# Altium schematic symbol library jlcpcb_2025_04_capacitors_extended_0201.schlib: 1175 symbols (part 4 of 7) (continued)
## GRM033R60J224ME90D
designator C?  Capacitance: 220nF  (hidden comment: *)
Capacitor, Ceramic (MLCC), 220nF, ±20%, 6.3V, X5R, ±20%, SMD 0201; Manufacturer: Murata Electronics; Manufacturer Part Number: GRM033R60J224ME90D; Package Size: 0201; JLCPCB Basic Part: No; JLCPCB Part Number: C161462; Supplier 1: LCSC; Category: Capacitors - MLCC; Supplier Part Number 1: C161462; Tolerance: ±20%; Voltage Rating: 6.3V; Temperature Coefficient: X5R; RoHS: Yes; ComponentLink1Description: Datasheet; ComponentLink1URL: https://wmsc.lcsc.com/wmsc/upload/file/pdf/v2/lcsc/2304140030_Murata-Electronics-GRM033R60J224ME90D_C161462.pdf; ComponentLink2Description: JLCPCB Part URL; ComponentLink2URL: https://jlcpcb.com/partdetail/C161462; ComponentLink3Description: LCSC Part URL; ComponentLink3URL: https://lcsc.com/product-detail/Multilayer-Ceramic-Capacitors-MLCC---SMD-SMT_Murata-Electronics-Murata-Electronics-GRM033R60J224ME90D_C161462.html
footprint CAP-0201 (0201 (0603M) Capacitor)
pins: 1, 2

## GRM033R60J225ME01D
designator C?  Capacitance: 2.2uF  (hidden comment: *)
Capacitor, Ceramic (MLCC), 2.2uF, ±20%, 6.3V, X5R, ±20%, SMD 0201; Manufacturer: Murata Electronics; Manufacturer Part Number: GRM033R60J225ME01D; Package Size: 0201; JLCPCB Basic Part: No; JLCPCB Part Number: C782150; Supplier 1: LCSC; Category: Capacitors - MLCC; Supplier Part Number 1: C782150; Tolerance: ±20%; Voltage Rating: 6.3V; Temperature Coefficient: X5R; RoHS: Yes; ComponentLink1Description: Datasheet; ComponentLink1URL: https://wmsc.lcsc.com/wmsc/upload/file/pdf/v2/lcsc/2009121209_Murata-Electronics-GRM033R60J225ME01D_C782150.pdf; ComponentLink2Description: JLCPCB Part URL; ComponentLink2URL: https://jlcpcb.com/partdetail/C782150; ComponentLink3Description: LCSC Part URL; ComponentLink3URL: https://lcsc.com/product-detail/Multilayer-Ceramic-Capacitors-MLCC---SMD-SMT_Murata-Electronics-Murata-Electronics-GRM033R60J225ME01D_C782150.html
footprint CAP-0201 (0201 (0603M) Capacitor)
pins: 1, 2

## GRM033R60J225ME47D
designator C?  Capacitance: 2.2uF  (hidden comment: *)
Capacitor, Ceramic (MLCC), 2.2uF, ±20%, 6.3V, X5R, ±20%, SMD 0201; Manufacturer: Murata Electronics; Manufacturer Part Number: GRM033R60J225ME47D; Package Size: 0201; JLCPCB Basic Part: No; JLCPCB Part Number: C76933; Supplier 1: LCSC; Category: Capacitors - MLCC; Supplier Part Number 1: C76933; Tolerance: ±20%; Voltage Rating: 6.3V; Temperature Coefficient: X5R; RoHS: Yes; ComponentLink1Description: Datasheet; ComponentLink1URL: https://wmsc.lcsc.com/wmsc/upload/file/pdf/v2/lcsc/1811081532_Murata-Electronics-GRM033R60J225ME47D_C76933.pdf; ComponentLink2Description: JLCPCB Part URL; ComponentLink2URL: https://jlcpcb.com/partdetail/C76933; ComponentLink3Description: LCSC Part URL; ComponentLink3URL: https://lcsc.com/product-detail/Multilayer-Ceramic-Capacitors-MLCC---SMD-SMT_Murata-Electronics-Murata-Electronics-GRM033R60J225ME47D_C76933.html
footprint CAP-0201 (0201 (0603M) Capacitor)
pins: 1, 2

## GRM033R60J334ME90D
designator C?  Capacitance: 330nF  (hidden comment: *)
Capacitor, Ceramic (MLCC), 330nF, ±20%, 6.3V, X5R, ±20%, SMD 0201; Manufacturer: Murata Electronics; Manufacturer Part Number: GRM033R60J334ME90D; Package Size: 0201; JLCPCB Basic Part: No; JLCPCB Part Number: C161463; Supplier 1: LCSC; Category: Capacitors - MLCC; Supplier Part Number 1: C161463; Tolerance: ±20%; Voltage Rating: 6.3V; Temperature Coefficient: X5R; RoHS: Yes; ComponentLink1Description: Datasheet; ComponentLink1URL: https://wmsc.lcsc.com/wmsc/upload/file/pdf/v2/lcsc/2304140030_Murata-Electronics-GRM033R60J334ME90D_C161463.pdf; ComponentLink2Description: JLCPCB Part URL; ComponentLink2URL: https://jlcpcb.com/partdetail/C161463; ComponentLink3Description: LCSC Part URL; ComponentLink3URL: https://lcsc.com/product-detail/Multilayer-Ceramic-Capacitors-MLCC---SMD-SMT_Murata-Electronics-Murata-Electronics-GRM033R60J334ME90D_C161463.html
footprint CAP-0201 (0201 (0603M) Capacitor)
pins: 1, 2

## GRM033R60J473KE19D
designator C?  Capacitance: 47nF  (hidden comment: *)
Capacitor, Ceramic (MLCC), 47nF, ±10%, 6.3V, X5R, ±10%, SMD 0201; Manufacturer: Murata Electronics; Manufacturer Part Number: GRM033R60J473KE19D; Package Size: 0201; JLCPCB Basic Part: No; JLCPCB Part Number: C85925; Supplier 1: LCSC; Category: Capacitors - MLCC; Supplier Part Number 1: C85925; Tolerance: ±10%; Voltage Rating: 6.3V; Temperature Coefficient: X5R; RoHS: Yes; ComponentLink1Description: Datasheet; ComponentLink1URL: https://wmsc.lcsc.com/wmsc/upload/file/pdf/v2/lcsc/2304140030_Murata-Electronics-GRM033R60J473KE19D_C85925.pdf; ComponentLink2Description: JLCPCB Part URL; ComponentLink2URL: https://jlcpcb.com/partdetail/C85925; ComponentLink3Description: LCSC Part URL; ComponentLink3URL: https://lcsc.com/product-detail/Multilayer-Ceramic-Capacitors-MLCC---SMD-SMT_Murata-Electronics-Murata-Electronics-GRM033R60J473KE19D_C85925.html
footprint CAP-0201 (0201 (0603M) Capacitor)
pins: 1, 2

## GRM033R60J474KE90D
designator C?  Capacitance: 470nF  (hidden comment: *)
Capacitor, Ceramic (MLCC), 470nF, ±10%, 6.3V, X5R, ±10%, SMD 0201; Manufacturer: Murata Electronics; Manufacturer Part Number: GRM033R60J474KE90D; Package Size: 0201; JLCPCB Basic Part: No; JLCPCB Part Number: C85926; Supplier 1: LCSC; Category: Capacitors - MLCC; Supplier Part Number 1: C85926; Tolerance: ±10%; Voltage Rating: 6.3V; Temperature Coefficient: X5R; RoHS: Yes; ComponentLink1Description: Datasheet; ComponentLink1URL: https://wmsc.lcsc.com/wmsc/upload/file/pdf/v2/lcsc/2212052030_Murata-Electronics-GRM033R60J474KE90D_C85926.pdf; ComponentLink2Description: JLCPCB Part URL; ComponentLink2URL: https://jlcpcb.com/partdetail/C85926; ComponentLink3Description: LCSC Part URL; ComponentLink3URL: https://lcsc.com/product-detail/Multilayer-Ceramic-Capacitors-MLCC---SMD-SMT_Murata-Electronics-Murata-Electronics-GRM033R60J474KE90D_C85926.html
footprint CAP-0201 (0201 (0603M) Capacitor)
pins: 1, 2

## GRM033R60J475ME05D
designator C?  Capacitance: 4.7uF  (hidden comment: *)
Capacitor, Ceramic (MLCC), 4.7uF, ±20%, 6.3V, X5R, ±20%, SMD 0201; Manufacturer: Murata Electronics; Manufacturer Part Number: GRM033R60J475ME05D; Package Size: 0201; JLCPCB Basic Part: No; JLCPCB Part Number: C3863497; Supplier 1: LCSC; Category: Capacitors - MLCC; Supplier Part Number 1: C3863497; Tolerance: ±20%; Voltage Rating: 6.3V; Temperature Coefficient: X5R; RoHS: Yes; ComponentLink1Description: Datasheet; ComponentLink1URL: https://wmsc.lcsc.com/wmsc/upload/file/pdf/v2/lcsc/2301301130_Murata-Electronics-GRM033R60J475ME05D_C3863497.pdf; ComponentLink2Description: JLCPCB Part URL; ComponentLink2URL: https://jlcpcb.com/partdetail/C3863497; ComponentLink3Description: LCSC Part URL; ComponentLink3URL: https://lcsc.com/product-detail/Multilayer-Ceramic-Capacitors-MLCC---SMD-SMT_Murata-Electronics-Murata-Electronics-GRM033R60J475ME05D_C3863497.html
footprint CAP-0201 (0201 (0603M) Capacitor)
pins: 1, 2

## GRM033R60J683KE19D
designator C?  Capacitance: 68nF  (hidden comment: *)
Capacitor, Ceramic (MLCC), 68nF, ±10%, 6.3V, X5R, ±10%, SMD 0201; Manufacturer: Murata Electronics; Manufacturer Part Number: GRM033R60J683KE19D; Package Size: 0201; JLCPCB Basic Part: No; JLCPCB Part Number: C161465; Supplier 1: LCSC; Category: Capacitors - MLCC; Supplier Part Number 1: C161465; Tolerance: ±10%; Voltage Rating: 6.3V; Temperature Coefficient: X5R; RoHS: Yes; ComponentLink1Description: Datasheet; ComponentLink1URL: https://wmsc.lcsc.com/wmsc/upload/file/pdf/v2/lcsc/2304140030_Murata-Electronics-GRM033R60J683KE19D_C161465.pdf; ComponentLink2Description: JLCPCB Part URL; ComponentLink2URL: https://jlcpcb.com/partdetail/C161465; ComponentLink3Description: LCSC Part URL; ComponentLink3URL: https://lcsc.com/product-detail/Multilayer-Ceramic-Capacitors-MLCC---SMD-SMT_Murata-Electronics-Murata-Electronics-GRM033R60J683KE19D_C161465.html
footprint CAP-0201 (0201 (0603M) Capacitor)
pins: 1, 2

## GRM033R60J823KE19D
designator C?  Capacitance: 82nF  (hidden comment: *)
Capacitor, Ceramic (MLCC), 82nF, ±10%, 6.3V, X5R, ±10%, SMD 0201; Manufacturer: Murata Electronics; Manufacturer Part Number: GRM033R60J823KE19D; Package Size: 0201; JLCPCB Basic Part: No; JLCPCB Part Number: C426105; Supplier 1: LCSC; Category: Capacitors - MLCC; Supplier Part Number 1: C426105; Tolerance: ±10%; Voltage Rating: 6.3V; Temperature Coefficient: X5R; RoHS: Yes; ComponentLink1Description: Datasheet; ComponentLink1URL: https://wmsc.lcsc.com/wmsc/upload/file/pdf/v2/lcsc/2304140030_Murata-Electronics-GRM033R60J823KE19D_C426105.pdf; ComponentLink2Description: JLCPCB Part URL; ComponentLink2URL: https://jlcpcb.com/partdetail/C426105; ComponentLink3Description: LCSC Part URL; ComponentLink3URL: https://lcsc.com/product-detail/Multilayer-Ceramic-Capacitors-MLCC---SMD-SMT_Murata-Electronics-Murata-Electronics-GRM033R60J823KE19D_C426105.html
footprint CAP-0201 (0201 (0603M) Capacitor)
pins: 1, 2

## GRM033R61A103KA01D
designator C?  Capacitance: 10nF  (hidden comment: *)
Capacitor, Ceramic (MLCC), 10nF, ±10%, 10V, X5R, ±10%, SMD 0201; Manufacturer: Murata Electronics; Manufacturer Part Number: GRM033R61A103KA01D; Package Size: 0201; JLCPCB Basic Part: No; JLCPCB Part Number: C97859; Supplier 1: LCSC; Category: Capacitors - MLCC; Supplier Part Number 1: C97859; Tolerance: ±10%; Voltage Rating: 10V; Temperature Coefficient: X5R; RoHS: Yes; ComponentLink1Description: Datasheet; ComponentLink1URL: https://wmsc.lcsc.com/wmsc/upload/file/pdf/v2/lcsc/1811081531_Murata-Electronics-GRM033R61A103KA01D_C97859.pdf; ComponentLink2Description: JLCPCB Part URL; ComponentLink2URL: https://jlcpcb.com/partdetail/C97859; ComponentLink3Description: LCSC Part URL; ComponentLink3URL: https://lcsc.com/product-detail/Multilayer-Ceramic-Capacitors-MLCC---SMD-SMT_Murata-Electronics-Murata-Electronics-GRM033R61A103KA01D_C97859.html
footprint CAP-0201 (0201 (0603M) Capacitor)
pins: 1, 2

## GRM033R61A104KE15D
designator C?  Capacitance: 100nF  (hidden comment: *)
Capacitor, Ceramic (MLCC), 100nF, ±10%, 10V, X5R, ±10%, SMD 0201; Manufacturer: Murata Electronics; Manufacturer Part Number: GRM033R61A104KE15D; Package Size: 0201; JLCPCB Basic Part: No; JLCPCB Part Number: C76934; Supplier 1: LCSC; Category: Capacitors - MLCC; Supplier Part Number 1: C76934; Tolerance: ±10%; Voltage Rating: 10V; Temperature Coefficient: X5R; RoHS: Yes; ComponentLink1Description: Datasheet; ComponentLink1URL: https://wmsc.lcsc.com/wmsc/upload/file/pdf/v2/lcsc/1811081532_Murata-Electronics-GRM033R61A104KE15D_C76934.pdf; ComponentLink2Description: JLCPCB Part URL; ComponentLink2URL: https://jlcpcb.com/partdetail/C76934; ComponentLink3Description: LCSC Part URL; ComponentLink3URL: https://lcsc.com/product-detail/Multilayer-Ceramic-Capacitors-MLCC---SMD-SMT_Murata-Electronics-Murata-Electronics-GRM033R61A104KE15D_C76934.html
footprint CAP-0201 (0201 (0603M) Capacitor)
pins: 1, 2

## GRM033R61A104KE84D
designator C?  Capacitance: 100nF  (hidden comment: *)
Capacitor, Ceramic (MLCC), 100nF, ±10%, 10V, X5R, ±10%, SMD 0201; Manufacturer: Murata Electronics; Manufacturer Part Number: GRM033R61A104KE84D; Package Size: 0201; JLCPCB Basic Part: No; JLCPCB Part Number: C161466; Supplier 1: LCSC; Category: Capacitors - MLCC; Supplier Part Number 1: C161466; Tolerance: ±10%; Voltage Rating: 10V; Temperature Coefficient: X5R; RoHS: Yes; ComponentLink1Description: Datasheet; ComponentLink1URL: https://wmsc.lcsc.com/wmsc/upload/file/pdf/v2/lcsc/1811081546_Murata-Electronics-GRM033R61A104KE84D_C161466.pdf; ComponentLink2Description: JLCPCB Part URL; ComponentLink2URL: https://jlcpcb.com/partdetail/C161466; ComponentLink3Description: LCSC Part URL; ComponentLink3URL: https://lcsc.com/product-detail/Multilayer-Ceramic-Capacitors-MLCC---SMD-SMT_Murata-Electronics-Murata-Electronics-GRM033R61A104KE84D_C161466.html
footprint CAP-0201 (0201 (0603M) Capacitor)
pins: 1, 2

## GRM033R61A104ME15D
designator C?  Capacitance: 100nF  (hidden comment: *)
Capacitor, Ceramic (MLCC), 100nF, ±20%, 10V, X5R, ±20%, SMD 0201; Manufacturer: Murata Electronics; Manufacturer Part Number: GRM033R61A104ME15D; Package Size: 0201; JLCPCB Basic Part: No; JLCPCB Part Number: C408130; Supplier 1: LCSC; Category: Capacitors - MLCC; Supplier Part Number 1: C408130; Tolerance: ±20%; Voltage Rating: 10V; Temperature Coefficient: X5R; RoHS: Yes; ComponentLink1Description: Datasheet; ComponentLink1URL: https://wmsc.lcsc.com/wmsc/upload/file/pdf/v2/lcsc/2304140030_Murata-Electronics-GRM033R61A104ME15D_C408130.pdf; ComponentLink2Description: JLCPCB Part URL; ComponentLink2URL: https://jlcpcb.com/partdetail/C408130; ComponentLink3Description: LCSC Part URL; ComponentLink3URL: https://lcsc.com/product-detail/Multilayer-Ceramic-Capacitors-MLCC---SMD-SMT_Murata-Electronics-Murata-Electronics-GRM033R61A104ME15D_C408130.html
footprint CAP-0201 (0201 (0603M) Capacitor)
pins: 1, 2

## GRM033R61A105ME44D
designator C?  Capacitance: 1uF  (hidden comment: *)
Capacitor, Ceramic (MLCC), 1uF, ±20%, 10V, X5R, ±20%, SMD 0201; Manufacturer: Murata Electronics; Manufacturer Part Number: GRM033R61A105ME44D; Package Size: 0201; JLCPCB Basic Part: No; JLCPCB Part Number: C76935; Supplier 1: LCSC; Category: Capacitors - MLCC; Supplier Part Number 1: C76935; Tolerance: ±20%; Voltage Rating: 10V; Temperature Coefficient: X5R; RoHS: Yes; ComponentLink1Description: Datasheet; ComponentLink1URL: https://wmsc.lcsc.com/wmsc/upload/file/pdf/v2/lcsc/2304140030_Murata-Electronics-GRM033R61A105ME44D_C76935.pdf; ComponentLink2Description: JLCPCB Part URL; ComponentLink2URL: https://jlcpcb.com/partdetail/C76935; ComponentLink3Description: LCSC Part URL; ComponentLink3URL: https://lcsc.com/product-detail/Multilayer-Ceramic-Capacitors-MLCC---SMD-SMT_Murata-Electronics-Murata-Electronics-GRM033R61A105ME44D_C76935.html
footprint CAP-0201 (0201 (0603M) Capacitor)
pins: 1, 2

## GRM033R61A123KE84D
designator C?  Capacitance: 12nF  (hidden comment: *)
Capacitor, Ceramic (MLCC), 12nF, ±10%, ±10%, SMD 0201; Manufacturer: Murata Electronics; Manufacturer Part Number: GRM033R61A123KE84D; Package Size: 0201; JLCPCB Basic Part: No; JLCPCB Part Number: C883551; Supplier 1: LCSC; Category: Capacitors - MLCC; Supplier Part Number 1: C883551; Tolerance: ±10%; RoHS: Yes; ComponentLink1Description: Datasheet; ComponentLink1URL: https://wmsc.lcsc.com/wmsc/upload/file/pdf/v2/lcsc/2304140030_Murata-Electronics-GRM033R61A123KE84D_C883551.pdf; ComponentLink2Description: JLCPCB Part URL; ComponentLink2URL: https://jlcpcb.com/partdetail/C883551; ComponentLink3Description: LCSC Part URL; ComponentLink3URL: https://lcsc.com/product-detail/Multilayer-Ceramic-Capacitors-MLCC---SMD-SMT_Murata-Electronics-Murata-Electronics-GRM033R61A123KE84D_C883551.html
footprint CAP-0201 (0201 (0603M) Capacitor)
pins: 1, 2

## GRM033R61A152KA01D
designator C?  Capacitance: 1.5nF  (hidden comment: *)
Capacitor, Ceramic (MLCC), 1.5nF, ±10%, 10V, X5R, ±10%, SMD 0201; Manufacturer: Murata Electronics; Manufacturer Part Number: GRM033R61A152KA01D; Package Size: 0201; JLCPCB Basic Part: No; JLCPCB Part Number: C723322; Supplier 1: LCSC; Category: Capacitors - MLCC; Supplier Part Number 1: C723322; Tolerance: ±10%; Voltage Rating: 10V; Temperature Coefficient: X5R; RoHS: Yes; ComponentLink1Description: Datasheet; ComponentLink1URL: https://wmsc.lcsc.com/wmsc/upload/file/pdf/v2/lcsc/2304140030_Murata-Electronics-GRM033R61A152KA01D_C723322.pdf; ComponentLink2Description: JLCPCB Part URL; ComponentLink2URL: https://jlcpcb.com/partdetail/C723322; ComponentLink3Description: LCSC Part URL; ComponentLink3URL: https://lcsc.com/product-detail/Multilayer-Ceramic-Capacitors-MLCC---SMD-SMT_Murata-Electronics-Murata-Electronics-GRM033R61A152KA01D_C723322.html
footprint CAP-0201 (0201 (0603M) Capacitor)
pins: 1, 2

## GRM033R61A183KE84D
designator C?  Capacitance: 18nF  (hidden comment: *)
Capacitor, Ceramic (MLCC), 18nF, ±10%, ±10%, SMD 0201; Manufacturer: Murata Electronics; Manufacturer Part Number: GRM033R61A183KE84D; Package Size: 0201; JLCPCB Basic Part: No; JLCPCB Part Number: C521081; Supplier 1: LCSC; Category: Capacitors - MLCC; Supplier Part Number 1: C521081; Tolerance: ±10%; RoHS: Yes; ComponentLink1Description: Datasheet; ComponentLink1URL: https://wmsc.lcsc.com/wmsc/upload/file/pdf/v2/lcsc/2308111810_Murata-Electronics-GRM033R61A183KE84D_C521081.pdf; ComponentLink2Description: JLCPCB Part URL; ComponentLink2URL: https://jlcpcb.com/partdetail/C521081; ComponentLink3Description: LCSC Part URL; ComponentLink3URL: https://lcsc.com/product-detail/Multilayer-Ceramic-Capacitors-MLCC---SMD-SMT_Murata-Electronics-Murata-Electronics-GRM033R61A183KE84D_C521081.html
footprint CAP-0201 (0201 (0603M) Capacitor)
pins: 1, 2

## GRM033R61A222KA01D
designator C?  Capacitance: 2.2nF  (hidden comment: *)
Capacitor, Ceramic (MLCC), 2.2nF, ±10%, 10V, X5R, ±10%, SMD 0201; Manufacturer: Murata Electronics; Manufacturer Part Number: GRM033R61A222KA01D; Package Size: 0201; JLCPCB Basic Part: No; JLCPCB Part Number: C337486; Supplier 1: LCSC; Category: Capacitors - MLCC; Supplier Part Number 1: C337486; Tolerance: ±10%; Voltage Rating: 10V; Temperature Coefficient: X5R; RoHS: Yes; ComponentLink1Description: Datasheet; ComponentLink1URL: https://wmsc.lcsc.com/wmsc/upload/file/pdf/v2/lcsc/2304140030_Murata-Electronics-GRM033R61A222KA01D_C337486.pdf; ComponentLink2Description: JLCPCB Part URL; ComponentLink2URL: https://jlcpcb.com/partdetail/C337486; ComponentLink3Description: LCSC Part URL; ComponentLink3URL: https://lcsc.com/product-detail/Multilayer-Ceramic-Capacitors-MLCC---SMD-SMT_Murata-Electronics-Murata-Electronics-GRM033R61A222KA01D_C337486.html
footprint CAP-0201 (0201 (0603M) Capacitor)
pins: 1, 2

## GRM033R61A224KE90D
designator C?  Capacitance: 220nF  (hidden comment: *)
Capacitor, Ceramic (MLCC), 220nF, ±10%, 10V, X5R, ±10%, SMD 0201; Manufacturer: Murata Electronics; Manufacturer Part Number: GRM033R61A224KE90D; Package Size: 0201; JLCPCB Basic Part: No; JLCPCB Part Number: C76936; Supplier 1: LCSC; Category: Capacitors - MLCC; Supplier Part Number 1: C76936; Tolerance: ±10%; Voltage Rating: 10V; Temperature Coefficient: X5R; RoHS: Yes; ComponentLink1Description: Datasheet; ComponentLink1URL: https://wmsc.lcsc.com/wmsc/upload/file/pdf/v2/lcsc/1811081514_Murata-Electronics-GRM033R61A224KE90D_C76936.pdf; ComponentLink2Description: JLCPCB Part URL; ComponentLink2URL: https://jlcpcb.com/partdetail/C76936; ComponentLink3Description: LCSC Part URL; ComponentLink3URL: https://lcsc.com/product-detail/Multilayer-Ceramic-Capacitors-MLCC---SMD-SMT_Murata-Electronics-Murata-Electronics-GRM033R61A224KE90D_C76936.html
footprint CAP-0201 (0201 (0603M) Capacitor)
pins: 1, 2

## GRM033R61A224ME90D
designator C?  Capacitance: 220nF  (hidden comment: *)
Capacitor, Ceramic (MLCC), 220nF, ±20%, 10V, X5R, ±20%, SMD 0201; Manufacturer: Murata Electronics; Manufacturer Part Number: GRM033R61A224ME90D; Package Size: 0201; JLCPCB Basic Part: No; JLCPCB Part Number: C161468; Supplier 1: LCSC; Category: Capacitors - MLCC; Supplier Part Number 1: C161468; Tolerance: ±20%; Voltage Rating: 10V; Temperature Coefficient: X5R; RoHS: Yes; ComponentLink1Description: Datasheet; ComponentLink1URL: https://wmsc.lcsc.com/wmsc/upload/file/pdf/v2/lcsc/2304140030_Murata-Electronics-GRM033R61A224ME90D_C161468.pdf; ComponentLink2Description: JLCPCB Part URL; ComponentLink2URL: https://jlcpcb.com/partdetail/C161468; ComponentLink3Description: LCSC Part URL; ComponentLink3URL: https://lcsc.com/product-detail/Multilayer-Ceramic-Capacitors-MLCC---SMD-SMT_Murata-Electronics-Murata-Electronics-GRM033R61A224ME90D_C161468.html
footprint CAP-0201 (0201 (0603M) Capacitor)
pins: 1, 2

## GRM033R61A225KE47D
designator C?  Capacitance: 2.2uF  (hidden comment: *)
Capacitor, Ceramic (MLCC), 2.2uF, ±10%, 10V, X5R, ±10%, SMD 0201; Manufacturer: Murata Electronics; Manufacturer Part Number: GRM033R61A225KE47D; Package Size: 0201; JLCPCB Basic Part: No; JLCPCB Part Number: C335106; Supplier 1: LCSC; Category: Capacitors - MLCC; Supplier Part Number 1: C335106; Tolerance: ±10%; Voltage Rating: 10V; Temperature Coefficient: X5R; RoHS: Yes; ComponentLink1Description: Datasheet; ComponentLink1URL: https://wmsc.lcsc.com/wmsc/upload/file/pdf/v2/lcsc/2304140030_Murata-Electronics-GRM033R61A225KE47D_C335106.pdf; ComponentLink2Description: JLCPCB Part URL; ComponentLink2URL: https://jlcpcb.com/partdetail/C335106; ComponentLink3Description: LCSC Part URL; ComponentLink3URL: https://lcsc.com/product-detail/Multilayer-Ceramic-Capacitors-MLCC---SMD-SMT_Murata-Electronics-Murata-Electronics-GRM033R61A225KE47D_C335106.html
footprint CAP-0201 (0201 (0603M) Capacitor)
pins: 1, 2

## GRM033R61A225ME47D
designator C?  Capacitance: 2.2uF  (hidden comment: *)
Capacitor, Ceramic (MLCC), 2.2uF, ±20%, 10V, X5R, ±20%, SMD 0201; Manufacturer: Murata Electronics; Manufacturer Part Number: GRM033R61A225ME47D; Package Size: 0201; JLCPCB Basic Part: No; JLCPCB Part Number: C319184; Supplier 1: LCSC; Category: Capacitors - MLCC; Supplier Part Number 1: C319184; Tolerance: ±20%; Voltage Rating: 10V; Temperature Coefficient: X5R; RoHS: Yes; ComponentLink1Description: Datasheet; ComponentLink1URL: https://wmsc.lcsc.com/wmsc/upload/file/pdf/v2/lcsc/1811081547_Murata-Electronics-GRM033R61A225ME47D_C319184.pdf; ComponentLink2Description: JLCPCB Part URL; ComponentLink2URL: https://jlcpcb.com/partdetail/C319184; ComponentLink3Description: LCSC Part URL; ComponentLink3URL: https://lcsc.com/product-detail/Multilayer-Ceramic-Capacitors-MLCC---SMD-SMT_Murata-Electronics-Murata-Electronics-GRM033R61A225ME47D_C319184.html
footprint CAP-0201 (0201 (0603M) Capacitor)
pins: 1, 2

## GRM033R61A272KA01D
designator C?  Capacitance: 2.7nF  (hidden comment: *)
Capacitor, Ceramic (MLCC), 2.7nF, ±10%, 10V, X5R, ±10%, SMD 0201; Manufacturer: Murata Electronics; Manufacturer Part Number: GRM033R61A272KA01D; Package Size: 0201; JLCPCB Basic Part: No; JLCPCB Part Number: C913656; Supplier 1: LCSC; Category: Capacitors - MLCC; Supplier Part Number 1: C913656; Tolerance: ±10%; Voltage Rating: 10V; Temperature Coefficient: X5R; RoHS: Yes; ComponentLink1Description: Datasheet; ComponentLink1URL: https://wmsc.lcsc.com/wmsc/upload/file/pdf/v2/lcsc/2201131300_Murata-Electronics-GRM033R61A272KA01D_C913656.pdf; ComponentLink2Description: JLCPCB Part URL; ComponentLink2URL: https://jlcpcb.com/partdetail/C913656; ComponentLink3Description: LCSC Part URL; ComponentLink3URL: https://lcsc.com/product-detail/Multilayer-Ceramic-Capacitors-MLCC---SMD-SMT_Murata-Electronics-Murata-Electronics-GRM033R61A272KA01D_C913656.html
footprint CAP-0201 (0201 (0603M) Capacitor)
pins: 1, 2

## GRM033R61A333KE84D
designator C?  Capacitance: 33nF  (hidden comment: *)
Capacitor, Ceramic (MLCC), 33nF, ±10%, 10V, X5R, ±10%, SMD 0201; Manufacturer: Murata Electronics; Manufacturer Part Number: GRM033R61A333KE84D; Package Size: 0201; JLCPCB Basic Part: No; JLCPCB Part Number: C237415; Supplier 1: LCSC; Category: Capacitors - MLCC; Supplier Part Number 1: C237415; Tolerance: ±10%; Voltage Rating: 10V; Temperature Coefficient: X5R; RoHS: Yes; ComponentLink1Description: Datasheet; ComponentLink1URL: https://wmsc.lcsc.com/wmsc/upload/file/pdf/v2/lcsc/2304140030_Murata-Electronics-GRM033R61A333KE84D_C237415.pdf; ComponentLink2Description: JLCPCB Part URL; ComponentLink2URL: https://jlcpcb.com/partdetail/C237415; ComponentLink3Description: LCSC Part URL; ComponentLink3URL: https://lcsc.com/product-detail/Multilayer-Ceramic-Capacitors-MLCC---SMD-SMT_Murata-Electronics-Murata-Electronics-GRM033R61A333KE84D_C237415.html
footprint CAP-0201 (0201 (0603M) Capacitor)
pins: 1, 2

## GRM033R61A472KA01D
designator C?  Capacitance: 4.7nF  (hidden comment: *)
Capacitor, Ceramic (MLCC), 4.7nF, ±10%, 10V, X5R, ±10%, SMD 0201; Manufacturer: Murata Electronics; Manufacturer Part Number: GRM033R61A472KA01D; Package Size: 0201; JLCPCB Basic Part: No; JLCPCB Part Number: C161470; Supplier 1: LCSC; Category: Capacitors - MLCC; Supplier Part Number 1: C161470; Tolerance: ±10%; Voltage Rating: 10V; Temperature Coefficient: X5R; RoHS: Yes; ComponentLink1Description: Datasheet; ComponentLink1URL: https://wmsc.lcsc.com/wmsc/upload/file/pdf/v2/lcsc/2304140030_Murata-Electronics-GRM033R61A472KA01D_C161470.pdf; ComponentLink2Description: JLCPCB Part URL; ComponentLink2URL: https://jlcpcb.com/partdetail/C161470; ComponentLink3Description: LCSC Part URL; ComponentLink3URL: https://lcsc.com/product-detail/Multilayer-Ceramic-Capacitors-MLCC---SMD-SMT_Murata-Electronics-Murata-Electronics-GRM033R61A472KA01D_C161470.html
footprint CAP-0201 (0201 (0603M) Capacitor)
pins: 1, 2

## GRM033R61A562KA01D
designator C?  Capacitance: 5.6nF  (hidden comment: *)
Capacitor, Ceramic (MLCC), 5.6nF, ±10%, 10V, X5R, ±10%, SMD 0201; Manufacturer: Murata Electronics; Manufacturer Part Number: GRM033R61A562KA01D; Package Size: 0201; JLCPCB Basic Part: No; JLCPCB Part Number: C2171618; Supplier 1: LCSC; Category: Capacitors - MLCC; Supplier Part Number 1: C2171618; Tolerance: ±10%; Voltage Rating: 10V; Temperature Coefficient: X5R; RoHS: Yes; ComponentLink1Description: Datasheet; ComponentLink1URL: https://wmsc.lcsc.com/wmsc/upload/file/pdf/v2/lcsc/2308111716_Murata-Electronics-GRM033R61A562KA01D_C2171618.pdf; ComponentLink2Description: JLCPCB Part URL; ComponentLink2URL: https://jlcpcb.com/partdetail/C2171618; ComponentLink3Description: LCSC Part URL; ComponentLink3URL: https://lcsc.com/product-detail/Multilayer-Ceramic-Capacitors-MLCC---SMD-SMT_Murata-Electronics-Murata-Electronics-GRM033R61A562KA01D_C2171618.html
footprint CAP-0201 (0201 (0603M) Capacitor)
pins: 1, 2

## GRM033R61A682KA01D
designator C?  Capacitance: 6.8nF  (hidden comment: *)
Capacitor, Ceramic (MLCC), 6.8nF, ±10%, 10V, X5R, ±10%, SMD 0201; Manufacturer: Murata Electronics; Manufacturer Part Number: GRM033R61A682KA01D; Package Size: 0201; JLCPCB Basic Part: No; JLCPCB Part Number: C161471; Supplier 1: LCSC; Category: Capacitors - MLCC; Supplier Part Number 1: C161471; Tolerance: ±10%; Voltage Rating: 10V; Temperature Coefficient: X5R; RoHS: Yes; ComponentLink1Description: Datasheet; ComponentLink1URL: https://wmsc.lcsc.com/wmsc/upload/file/pdf/v2/lcsc/1811081546_Murata-Electronics-GRM033R61A682KA01D_C161471.pdf; ComponentLink2Description: JLCPCB Part URL; ComponentLink2URL: https://jlcpcb.com/partdetail/C161471; ComponentLink3Description: LCSC Part URL; ComponentLink3URL: https://lcsc.com/product-detail/Multilayer-Ceramic-Capacitors-MLCC---SMD-SMT_Murata-Electronics-Murata-Electronics-GRM033R61A682KA01D_C161471.html
footprint CAP-0201 (0201 (0603M) Capacitor)
pins: 1, 2

## GRM033R61C103KA12D
designator C?  Capacitance: 10nF  (hidden comment: *)
Capacitor, Ceramic (MLCC), 10nF, ±10%, 16V, X5R, ±10%, SMD 0201; Manufacturer: Murata Electronics; Manufacturer Part Number: GRM033R61C103KA12D; Package Size: 0201; JLCPCB Basic Part: No; JLCPCB Part Number: C161472; Supplier 1: LCSC; Category: Capacitors - MLCC; Supplier Part Number 1: C161472; Tolerance: ±10%; Voltage Rating: 16V; Temperature Coefficient: X5R; RoHS: Yes; ComponentLink1Description: Datasheet; ComponentLink1URL: https://wmsc.lcsc.com/wmsc/upload/file/pdf/v2/lcsc/1811081530_Murata-Electronics-GRM033R61C103KA12D_C161472.pdf; ComponentLink2Description: JLCPCB Part URL; ComponentLink2URL: https://jlcpcb.com/partdetail/C161472; ComponentLink3Description: LCSC Part URL; ComponentLink3URL: https://lcsc.com/product-detail/Multilayer-Ceramic-Capacitors-MLCC---SMD-SMT_Murata-Electronics-Murata-Electronics-GRM033R61C103KA12D_C161472.html
footprint CAP-0201 (0201 (0603M) Capacitor)
pins: 1, 2

## GRM033R61C103MA12D
designator C?  Capacitance: 10nF  (hidden comment: *)
Capacitor, Ceramic (MLCC), 10nF, ±20%, 16V, X5R, ±20%, SMD 0201; Manufacturer: Murata Electronics; Manufacturer Part Number: GRM033R61C103MA12D; Package Size: 0201; JLCPCB Basic Part: No; JLCPCB Part Number: C2183908; Supplier 1: LCSC; Category: Capacitors - MLCC; Supplier Part Number 1: C2183908; Tolerance: ±20%; Voltage Rating: 16V; Temperature Coefficient: X5R; RoHS: Yes; ComponentLink1Description: Datasheet; ComponentLink1URL: https://wmsc.lcsc.com/wmsc/upload/file/pdf/v2/lcsc/2202041400_Murata-Electronics-GRM033R61C103MA12D_C2183908.pdf; ComponentLink2Description: JLCPCB Part URL; ComponentLink2URL: https://jlcpcb.com/partdetail/C2183908; ComponentLink3Description: LCSC Part URL; ComponentLink3URL: https://lcsc.com/product-detail/Multilayer-Ceramic-Capacitors-MLCC---SMD-SMT_Murata-Electronics-Murata-Electronics-GRM033R61C103MA12D_C2183908.html
footprint CAP-0201 (0201 (0603M) Capacitor)
pins: 1, 2

## GRM033R61C104KE14D
designator C?  Capacitance: 100nF  (hidden comment: *)
Capacitor, Ceramic (MLCC), 100nF, ±10%, 16V, X5R, ±10%, SMD 0201; Manufacturer: Murata Electronics; Manufacturer Part Number: GRM033R61C104KE14D; Package Size: 0201; JLCPCB Basic Part: No; JLCPCB Part Number: C88916; Supplier 1: LCSC; Category: Capacitors - MLCC; Supplier Part Number 1: C88916; Tolerance: ±10%; Voltage Rating: 16V; Temperature Coefficient: X5R; RoHS: Yes; ComponentLink1Description: Datasheet; ComponentLink1URL: https://wmsc.lcsc.com/wmsc/upload/file/pdf/v2/lcsc/2304140030_Murata-Electronics-GRM033R61C104KE14D_C88916.pdf; ComponentLink2Description: JLCPCB Part URL; ComponentLink2URL: https://jlcpcb.com/partdetail/C88916; ComponentLink3Description: LCSC Part URL; ComponentLink3URL: https://lcsc.com/product-detail/Multilayer-Ceramic-Capacitors-MLCC---SMD-SMT_Murata-Electronics-Murata-Electronics-GRM033R61C104KE14D_C88916.html
footprint CAP-0201 (0201 (0603M) Capacitor)
pins: 1, 2

## GRM033R61C104KE18D
designator C?  Capacitance: 100nF  (hidden comment: *)
Capacitor, Ceramic (MLCC), 100nF, ±10%, 16V, X5R, ±10%, SMD 0201; Manufacturer: Murata Electronics; Manufacturer Part Number: GRM033R61C104KE18D; Package Size: 0201; JLCPCB Basic Part: No; JLCPCB Part Number: C454604; Supplier 1: LCSC; Category: Capacitors - MLCC; Supplier Part Number 1: C454604; Tolerance: ±10%; Voltage Rating: 16V; Temperature Coefficient: X5R; RoHS: Yes; ComponentLink1Description: Datasheet; ComponentLink1URL: https://wmsc.lcsc.com/wmsc/upload/file/pdf/v2/lcsc/1912111437_Murata-Electronics-GRM033R61C104KE18D_C454604.pdf; ComponentLink2Description: JLCPCB Part URL; ComponentLink2URL: https://jlcpcb.com/partdetail/C454604; ComponentLink3Description: LCSC Part URL; ComponentLink3URL: https://lcsc.com/product-detail/Multilayer-Ceramic-Capacitors-MLCC---SMD-SMT_Murata-Electronics-Murata-Electronics-GRM033R61C104KE18D_C454604.html
footprint CAP-0201 (0201 (0603M) Capacitor)
pins: 1, 2

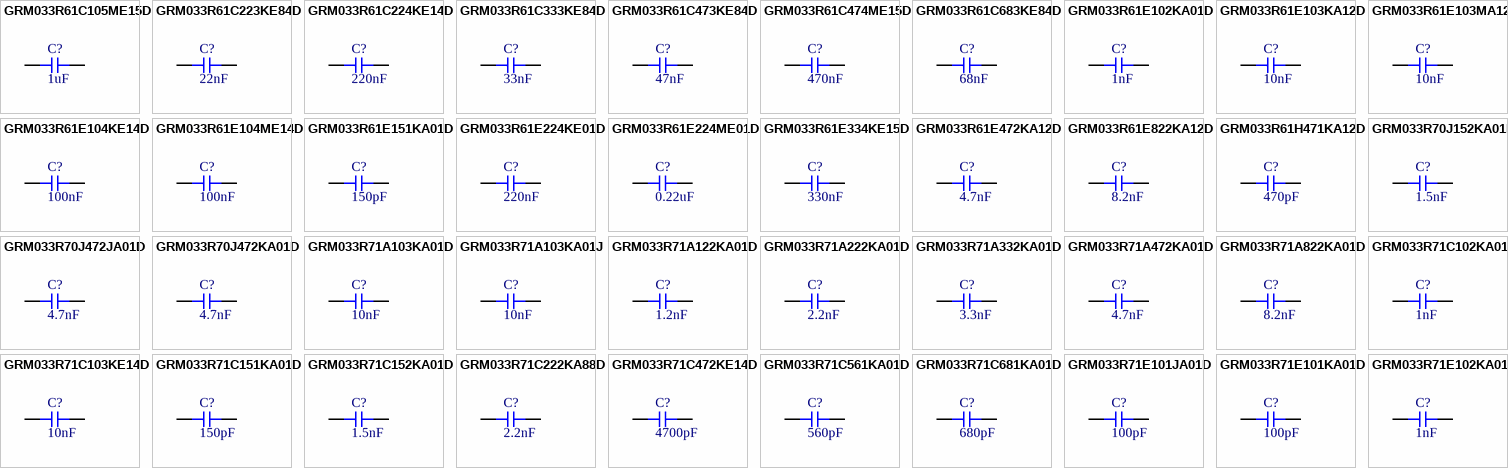
[diagram p18: symbols GRM033R61C105ME15D to GRM033R71E102KA01D]

## GRM033R61C105ME15D
designator C?  Capacitance: 1uF  (hidden comment: *)
Capacitor, Ceramic (MLCC), 1uF, ±20%, 16V, X5R, ±20%, SMD 0201; Manufacturer: Murata Electronics; Manufacturer Part Number: GRM033R61C105ME15D; Package Size: 0201; JLCPCB Basic Part: No; JLCPCB Part Number: C335102; Supplier 1: LCSC; Category: Capacitors - MLCC; Supplier Part Number 1: C335102; Tolerance: ±20%; Voltage Rating: 16V; Temperature Coefficient: X5R; RoHS: Yes; ComponentLink1Description: Datasheet; ComponentLink1URL: https://wmsc.lcsc.com/wmsc/upload/file/pdf/v2/lcsc/2304140030_Murata-Electronics-GRM033R61C105ME15D_C335102.pdf; ComponentLink2Description: JLCPCB Part URL; ComponentLink2URL: https://jlcpcb.com/partdetail/C335102; ComponentLink3Description: LCSC Part URL; ComponentLink3URL: https://lcsc.com/product-detail/Multilayer-Ceramic-Capacitors-MLCC---SMD-SMT_Murata-Electronics-Murata-Electronics-GRM033R61C105ME15D_C335102.html
footprint CAP-0201 (0201 (0603M) Capacitor)
pins: 1, 2

## GRM033R61C223KE84D
designator C?  Capacitance: 22nF  (hidden comment: *)
Capacitor, Ceramic (MLCC), 22nF, ±10%, 16V, X5R, ±10%, SMD 0201; Manufacturer: Murata Electronics; Manufacturer Part Number: GRM033R61C223KE84D; Package Size: 0201; JLCPCB Basic Part: No; JLCPCB Part Number: C161473; Supplier 1: LCSC; Category: Capacitors - MLCC; Supplier Part Number 1: C161473; Tolerance: ±10%; Voltage Rating: 16V; Temperature Coefficient: X5R; RoHS: Yes; ComponentLink1Description: Datasheet; ComponentLink1URL: https://wmsc.lcsc.com/wmsc/upload/file/pdf/v2/lcsc/1811081521_Murata-Electronics-GRM033R61C223KE84D_C161473.pdf; ComponentLink2Description: JLCPCB Part URL; ComponentLink2URL: https://jlcpcb.com/partdetail/C161473; ComponentLink3Description: LCSC Part URL; ComponentLink3URL: https://lcsc.com/product-detail/Multilayer-Ceramic-Capacitors-MLCC---SMD-SMT_Murata-Electronics-Murata-Electronics-GRM033R61C223KE84D_C161473.html
footprint CAP-0201 (0201 (0603M) Capacitor)
pins: 1, 2

## GRM033R61C224KE14D
designator C?  Capacitance: 220nF  (hidden comment: *)
Capacitor, Ceramic (MLCC), 220nF, ±10%, 16V, X5R, ±10%, SMD 0201; Manufacturer: Murata Electronics; Manufacturer Part Number: GRM033R61C224KE14D; Package Size: 0201; JLCPCB Basic Part: No; JLCPCB Part Number: C161474; Supplier 1: LCSC; Category: Capacitors - MLCC; Supplier Part Number 1: C161474; Tolerance: ±10%; Voltage Rating: 16V; Temperature Coefficient: X5R; RoHS: Yes; ComponentLink1Description: Datasheet; ComponentLink1URL: https://wmsc.lcsc.com/wmsc/upload/file/pdf/v2/lcsc/2304140030_Murata-Electronics-GRM033R61C224KE14D_C161474.pdf; ComponentLink2Description: JLCPCB Part URL; ComponentLink2URL: https://jlcpcb.com/partdetail/C161474; ComponentLink3Description: LCSC Part URL; ComponentLink3URL: https://lcsc.com/product-detail/Multilayer-Ceramic-Capacitors-MLCC---SMD-SMT_Murata-Electronics-Murata-Electronics-GRM033R61C224KE14D_C161474.html
footprint CAP-0201 (0201 (0603M) Capacitor)
pins: 1, 2

## GRM033R61C333KE84D
designator C?  Capacitance: 33nF  (hidden comment: *)
Capacitor, Ceramic (MLCC), 33nF, ±10%, 16V, X5R, ±10%, SMD 0201; Manufacturer: Murata Electronics; Manufacturer Part Number: GRM033R61C333KE84D; Package Size: 0201; JLCPCB Basic Part: No; JLCPCB Part Number: C161475; Supplier 1: LCSC; Category: Capacitors - MLCC; Supplier Part Number 1: C161475; Tolerance: ±10%; Voltage Rating: 16V; Temperature Coefficient: X5R; RoHS: Yes; ComponentLink1Description: Datasheet; ComponentLink1URL: https://wmsc.lcsc.com/wmsc/upload/file/pdf/v2/lcsc/1912111437_Murata-Electronics-GRM033R61C333KE84D_C161475.pdf; ComponentLink2Description: JLCPCB Part URL; ComponentLink2URL: https://jlcpcb.com/partdetail/C161475; ComponentLink3Description: LCSC Part URL; ComponentLink3URL: https://lcsc.com/product-detail/Multilayer-Ceramic-Capacitors-MLCC---SMD-SMT_Murata-Electronics-Murata-Electronics-GRM033R61C333KE84D_C161475.html
footprint CAP-0201 (0201 (0603M) Capacitor)
pins: 1, 2

## GRM033R61C473KE84D
designator C?  Capacitance: 47nF  (hidden comment: *)
Capacitor, Ceramic (MLCC), 47nF, ±10%, 16V, X5R, ±10%, SMD 0201; Manufacturer: Murata Electronics; Manufacturer Part Number: GRM033R61C473KE84D; Package Size: 0201; JLCPCB Basic Part: No; JLCPCB Part Number: C88917; Supplier 1: LCSC; Category: Capacitors - MLCC; Supplier Part Number 1: C88917; Tolerance: ±10%; Voltage Rating: 16V; Temperature Coefficient: X5R; RoHS: Yes; ComponentLink1Description: Datasheet; ComponentLink1URL: https://wmsc.lcsc.com/wmsc/upload/file/pdf/v2/lcsc/2304140030_Murata-Electronics-GRM033R61C473KE84D_C88917.pdf; ComponentLink2Description: JLCPCB Part URL; ComponentLink2URL: https://jlcpcb.com/partdetail/C88917; ComponentLink3Description: LCSC Part URL; ComponentLink3URL: https://lcsc.com/product-detail/Multilayer-Ceramic-Capacitors-MLCC---SMD-SMT_Murata-Electronics-Murata-Electronics-GRM033R61C473KE84D_C88917.html
footprint CAP-0201 (0201 (0603M) Capacitor)
pins: 1, 2

## GRM033R61C474ME15D
designator C?  Capacitance: 470nF  (hidden comment: *)
Capacitor, Ceramic (MLCC), 470nF, ±20%, 16V, X5R, ±20%, SMD 0201; Manufacturer: Murata Electronics; Manufacturer Part Number: GRM033R61C474ME15D; Package Size: 0201; JLCPCB Basic Part: No; JLCPCB Part Number: C2976064; Supplier 1: LCSC; Category: Capacitors - MLCC; Supplier Part Number 1: C2976064; Tolerance: ±20%; Voltage Rating: 16V; Temperature Coefficient: X5R; RoHS: Yes; ComponentLink1Description: Datasheet; ComponentLink2Description: JLCPCB Part URL; ComponentLink2URL: https://jlcpcb.com/partdetail/C2976064; ComponentLink3Description: LCSC Part URL; ComponentLink3URL: https://lcsc.com/product-detail/Multilayer-Ceramic-Capacitors-MLCC---SMD-SMT_Murata-Electronics-Murata-Electronics-GRM033R61C474ME15D_C2976064.html
footprint CAP-0201 (0201 (0603M) Capacitor)
pins: 1, 2

## GRM033R61C683KE84D
designator C?  Capacitance: 68nF  (hidden comment: *)
Capacitor, Ceramic (MLCC), 68nF, ±10%, 16V, X5R, ±10%, SMD 0201; Manufacturer: Murata Electronics; Manufacturer Part Number: GRM033R61C683KE84D; Package Size: 0201; JLCPCB Basic Part: No; JLCPCB Part Number: C161476; Supplier 1: LCSC; Category: Capacitors - MLCC; Supplier Part Number 1: C161476; Tolerance: ±10%; Voltage Rating: 16V; Temperature Coefficient: X5R; RoHS: Yes; ComponentLink1Description: Datasheet; ComponentLink1URL: https://wmsc.lcsc.com/wmsc/upload/file/pdf/v2/lcsc/2304140030_Murata-Electronics-GRM033R61C683KE84D_C161476.pdf; ComponentLink2Description: JLCPCB Part URL; ComponentLink2URL: https://jlcpcb.com/partdetail/C161476; ComponentLink3Description: LCSC Part URL; ComponentLink3URL: https://lcsc.com/product-detail/Multilayer-Ceramic-Capacitors-MLCC---SMD-SMT_Murata-Electronics-Murata-Electronics-GRM033R61C683KE84D_C161476.html
footprint CAP-0201 (0201 (0603M) Capacitor)
pins: 1, 2

## GRM033R61E102KA01D
designator C?  Capacitance: 1nF  (hidden comment: *)
Capacitor, Ceramic (MLCC), 1nF, ±10%, 25V, X5R, ±10%, SMD 0201; Manufacturer: Murata Electronics; Manufacturer Part Number: GRM033R61E102KA01D; Package Size: 0201; JLCPCB Basic Part: No; JLCPCB Part Number: C161477; Supplier 1: LCSC; Category: Capacitors - MLCC; Supplier Part Number 1: C161477; Tolerance: ±10%; Voltage Rating: 25V; Temperature Coefficient: X5R; RoHS: Yes; ComponentLink1Description: Datasheet; ComponentLink1URL: https://wmsc.lcsc.com/wmsc/upload/file/pdf/v2/lcsc/1811081546_Murata-Electronics-GRM033R61E102KA01D_C161477.pdf; ComponentLink2Description: JLCPCB Part URL; ComponentLink2URL: https://jlcpcb.com/partdetail/C161477; ComponentLink3Description: LCSC Part URL; ComponentLink3URL: https://lcsc.com/product-detail/Multilayer-Ceramic-Capacitors-MLCC---SMD-SMT_Murata-Electronics-Murata-Electronics-GRM033R61E102KA01D_C161477.html
footprint CAP-0201 (0201 (0603M) Capacitor)
pins: 1, 2

## GRM033R61E103KA12D
designator C?  Capacitance: 10nF  (hidden comment: *)
Capacitor, Ceramic (MLCC), 10nF, ±10%, 25V, X5R, ±10%, SMD 0201; Manufacturer: Murata Electronics; Manufacturer Part Number: GRM033R61E103KA12D; Package Size: 0201; JLCPCB Basic Part: No; JLCPCB Part Number: C76938; Supplier 1: LCSC; Category: Capacitors - MLCC; Supplier Part Number 1: C76938; Tolerance: ±10%; Voltage Rating: 25V; Temperature Coefficient: X5R; RoHS: Yes; ComponentLink1Description: Datasheet; ComponentLink1URL: https://wmsc.lcsc.com/wmsc/upload/file/pdf/v2/lcsc/1811081532_Murata-Electronics-GRM033R61E103KA12D_C76938.pdf; ComponentLink2Description: JLCPCB Part URL; ComponentLink2URL: https://jlcpcb.com/partdetail/C76938; ComponentLink3Description: LCSC Part URL; ComponentLink3URL: https://lcsc.com/product-detail/Multilayer-Ceramic-Capacitors-MLCC---SMD-SMT_Murata-Electronics-Murata-Electronics-GRM033R61E103KA12D_C76938.html
footprint CAP-0201 (0201 (0603M) Capacitor)
pins: 1, 2

## GRM033R61E103MA12D
designator C?  Capacitance: 10nF  (hidden comment: *)
Capacitor, Ceramic (MLCC), 10nF, ±20%, 25V, X5R, ±20%, SMD 0201; Manufacturer: Murata Electronics; Manufacturer Part Number: GRM033R61E103MA12D; Package Size: 0201; JLCPCB Basic Part: No; JLCPCB Part Number: C2168386; Supplier 1: LCSC; Category: Capacitors - MLCC; Supplier Part Number 1: C2168386; Tolerance: ±20%; Voltage Rating: 25V; Temperature Coefficient: X5R; RoHS: Yes; ComponentLink1Description: Datasheet; ComponentLink1URL: https://wmsc.lcsc.com/wmsc/upload/file/pdf/v2/lcsc/2202040300_Murata-Electronics-GRM033R61E103MA12D_C2168386.pdf; ComponentLink2Description: JLCPCB Part URL; ComponentLink2URL: https://jlcpcb.com/partdetail/C2168386; ComponentLink3Description: LCSC Part URL; ComponentLink3URL: https://lcsc.com/product-detail/Multilayer-Ceramic-Capacitors-MLCC---SMD-SMT_Murata-Electronics-Murata-Electronics-GRM033R61E103MA12D_C2168386.html
footprint CAP-0201 (0201 (0603M) Capacitor)
pins: 1, 2

## GRM033R61E104KE14D
designator C?  Capacitance: 100nF  (hidden comment: *)
Capacitor, Ceramic (MLCC), 100nF, ±10%, 25V, X5R, ±10%, SMD 0201; Manufacturer: Murata Electronics; Manufacturer Part Number: GRM033R61E104KE14D; Package Size: 0201; JLCPCB Basic Part: No; JLCPCB Part Number: C76939; Supplier 1: LCSC; Category: Capacitors - MLCC; Supplier Part Number 1: C76939; Tolerance: ±10%; Voltage Rating: 25V; Temperature Coefficient: X5R; RoHS: Yes; ComponentLink1Description: Datasheet; ComponentLink1URL: https://wmsc.lcsc.com/wmsc/upload/file/pdf/v2/lcsc/1811081532_Murata-Electronics-GRM033R61E104KE14D_C76939.pdf; ComponentLink2Description: JLCPCB Part URL; ComponentLink2URL: https://jlcpcb.com/partdetail/C76939; ComponentLink3Description: LCSC Part URL; ComponentLink3URL: https://lcsc.com/product-detail/Multilayer-Ceramic-Capacitors-MLCC---SMD-SMT_Murata-Electronics-Murata-Electronics-GRM033R61E104KE14D_C76939.html
footprint CAP-0201 (0201 (0603M) Capacitor)
pins: 1, 2

## GRM033R61E104ME14D
designator C?  Capacitance: 100nF  (hidden comment: *)
Capacitor, Ceramic (MLCC), 100nF, ±20%, 25V, X5R, ±20%, SMD 0201; Manufacturer: Murata Electronics; Manufacturer Part Number: GRM033R61E104ME14D; Package Size: 0201; JLCPCB Basic Part: No; JLCPCB Part Number: C2649557; Supplier 1: LCSC; Category: Capacitors - MLCC; Supplier Part Number 1: C2649557; Tolerance: ±20%; Voltage Rating: 25V; Temperature Coefficient: X5R; RoHS: Yes; ComponentLink1Description: Datasheet; ComponentLink1URL: https://wmsc.lcsc.com/wmsc/upload/file/pdf/v2/lcsc/2108070630_Murata-Electronics-GRM033R61E104ME14D_C2649557.pdf; ComponentLink2Description: JLCPCB Part URL; ComponentLink2URL: https://jlcpcb.com/partdetail/C2649557; ComponentLink3Description: LCSC Part URL; ComponentLink3URL: https://lcsc.com/product-detail/Multilayer-Ceramic-Capacitors-MLCC---SMD-SMT_Murata-Electronics-Murata-Electronics-GRM033R61E104ME14D_C2649557.html
footprint CAP-0201 (0201 (0603M) Capacitor)
pins: 1, 2

## GRM033R61E151KA01D
designator C?  Capacitance: 150pF  (hidden comment: *)
Capacitor, Ceramic (MLCC), 150pF, ±10%, 25V, X5R, ±10%, SMD 0201; Manufacturer: Murata Electronics; Manufacturer Part Number: GRM033R61E151KA01D; Package Size: 0201; JLCPCB Basic Part: No; JLCPCB Part Number: C3843470; Supplier 1: LCSC; Category: Capacitors - MLCC; Supplier Part Number 1: C3843470; Tolerance: ±10%; Voltage Rating: 25V; Temperature Coefficient: X5R; RoHS: Yes; ComponentLink1Description: Datasheet; ComponentLink1URL: https://wmsc.lcsc.com/wmsc/upload/file/pdf/v2/lcsc/2308111503_Murata-Electronics-GRM033R61E151KA01D_C3843470.pdf; ComponentLink2Description: JLCPCB Part URL; ComponentLink2URL: https://jlcpcb.com/partdetail/C3843470; ComponentLink3Description: LCSC Part URL; ComponentLink3URL: https://lcsc.com/product-detail/Multilayer-Ceramic-Capacitors-MLCC---SMD-SMT_Murata-Electronics-Murata-Electronics-GRM033R61E151KA01D_C3843470.html
footprint CAP-0201 (0201 (0603M) Capacitor)
pins: 1, 2

## GRM033R61E224KE01D
designator C?  Capacitance: 220nF  (hidden comment: *)
Capacitor, Ceramic (MLCC), 220nF, ±10%, 25V, X5R, ±10%, SMD 0201; Manufacturer: Murata Electronics; Manufacturer Part Number: GRM033R61E224KE01D; Package Size: 0201; JLCPCB Basic Part: No; JLCPCB Part Number: C701263; Supplier 1: LCSC; Category: Capacitors - MLCC; Supplier Part Number 1: C701263; Tolerance: ±10%; Voltage Rating: 25V; Temperature Coefficient: X5R; RoHS: Yes; ComponentLink1Description: Datasheet; ComponentLink1URL: https://wmsc.lcsc.com/wmsc/upload/file/pdf/v2/lcsc/2304140030_Murata-Electronics-GRM033R61E224KE01D_C701263.pdf; ComponentLink2Description: JLCPCB Part URL; ComponentLink2URL: https://jlcpcb.com/partdetail/C701263; ComponentLink3Description: LCSC Part URL; ComponentLink3URL: https://lcsc.com/product-detail/Multilayer-Ceramic-Capacitors-MLCC---SMD-SMT_Murata-Electronics-Murata-Electronics-GRM033R61E224KE01D_C701263.html
footprint CAP-0201 (0201 (0603M) Capacitor)
pins: 1, 2

## GRM033R61E224ME01D
designator C?  Capacitance: 0.22uF  (hidden comment: *)
Capacitor, Ceramic (MLCC), 0.22uF, ±20%, 25V, X5R, ±20%, SMD 0201; Manufacturer: Murata Electronics; Manufacturer Part Number: GRM033R61E224ME01D; Package Size: 0201; JLCPCB Basic Part: No; JLCPCB Part Number: C710823; Supplier 1: LCSC; Category: Capacitors - MLCC; Supplier Part Number 1: C710823; Tolerance: ±20%; Voltage Rating: 25V; Temperature Coefficient: X5R; RoHS: Yes; ComponentLink1Description: Datasheet; ComponentLink1URL: https://wmsc.lcsc.com/wmsc/upload/file/pdf/v2/lcsc/2308111812_Murata-Electronics-GRM033R61E224ME01D_C710823.pdf; ComponentLink2Description: JLCPCB Part URL; ComponentLink2URL: https://jlcpcb.com/partdetail/C710823; ComponentLink3Description: LCSC Part URL; ComponentLink3URL: https://lcsc.com/product-detail/Multilayer-Ceramic-Capacitors-MLCC---SMD-SMT_Murata-Electronics-Murata-Electronics-GRM033R61E224ME01D_C710823.html
footprint CAP-0201 (0201 (0603M) Capacitor)
pins: 1, 2

## GRM033R61E334KE15D
designator C?  Capacitance: 330nF  (hidden comment: *)
Capacitor, Ceramic (MLCC), 330nF, ±10%, ±10%, SMD 0201; Manufacturer: Murata Electronics; Manufacturer Part Number: GRM033R61E334KE15D; Package Size: 0201; JLCPCB Basic Part: No; JLCPCB Part Number: C723889; Supplier 1: LCSC; Category: Capacitors - MLCC; Supplier Part Number 1: C723889; Tolerance: ±10%; RoHS: Yes; ComponentLink1Description: Datasheet; ComponentLink1URL: https://wmsc.lcsc.com/wmsc/upload/file/pdf/v2/lcsc/2011101005_Murata-Electronics-GRM033R61E334KE15D_C723889.pdf; ComponentLink2Description: JLCPCB Part URL; ComponentLink2URL: https://jlcpcb.com/partdetail/C723889; ComponentLink3Description: LCSC Part URL; ComponentLink3URL: https://lcsc.com/product-detail/Multilayer-Ceramic-Capacitors-MLCC---SMD-SMT_Murata-Electronics-Murata-Electronics-GRM033R61E334KE15D_C723889.html
footprint CAP-0201 (0201 (0603M) Capacitor)
pins: 1, 2

## GRM033R61E472KA12D
designator C?  Capacitance: 4.7nF  (hidden comment: *)
Capacitor, Ceramic (MLCC), 4.7nF, ±10%, 25V, X5R, ±10%, SMD 0201; Manufacturer: Murata Electronics; Manufacturer Part Number: GRM033R61E472KA12D; Package Size: 0201; JLCPCB Basic Part: No; JLCPCB Part Number: C161478; Supplier 1: LCSC; Category: Capacitors - MLCC; Supplier Part Number 1: C161478; Tolerance: ±10%; Voltage Rating: 25V; Temperature Coefficient: X5R; RoHS: Yes; ComponentLink1Description: Datasheet; ComponentLink1URL: https://wmsc.lcsc.com/wmsc/upload/file/pdf/v2/lcsc/1811131851_Murata-Electronics-GRM033R61E472KA12D_C161478.pdf; ComponentLink2Description: JLCPCB Part URL; ComponentLink2URL: https://jlcpcb.com/partdetail/C161478; ComponentLink3Description: LCSC Part URL; ComponentLink3URL: https://lcsc.com/product-detail/Multilayer-Ceramic-Capacitors-MLCC---SMD-SMT_Murata-Electronics-Murata-Electronics-GRM033R61E472KA12D_C161478.html
footprint CAP-0201 (0201 (0603M) Capacitor)
pins: 1, 2

## GRM033R61E822KA12D
designator C?  Capacitance: 8.2nF  (hidden comment: *)
Capacitor, Ceramic (MLCC), 8.2nF, ±10%, 25V, X5R, ±10%, SMD 0201; Manufacturer: Murata Electronics; Manufacturer Part Number: GRM033R61E822KA12D; Package Size: 0201; JLCPCB Basic Part: No; JLCPCB Part Number: C710826; Supplier 1: LCSC; Category: Capacitors - MLCC; Supplier Part Number 1: C710826; Tolerance: ±10%; Voltage Rating: 25V; Temperature Coefficient: X5R; RoHS: Yes; ComponentLink1Description: Datasheet; ComponentLink1URL: https://wmsc.lcsc.com/wmsc/upload/file/pdf/v2/lcsc/2210190600_Murata-Electronics-GRM033R61E822KA12D_C710826.pdf; ComponentLink2Description: JLCPCB Part URL; ComponentLink2URL: https://jlcpcb.com/partdetail/C710826; ComponentLink3Description: LCSC Part URL; ComponentLink3URL: https://lcsc.com/product-detail/Multilayer-Ceramic-Capacitors-MLCC---SMD-SMT_Murata-Electronics-Murata-Electronics-GRM033R61E822KA12D_C710826.html
footprint CAP-0201 (0201 (0603M) Capacitor)
pins: 1, 2